# Altium integrated library Lattice CPLD ispLSI.IntLib: 471 symbols (part 15 of 26) (continued)
## ispLSI3256A-70LQI (continued)
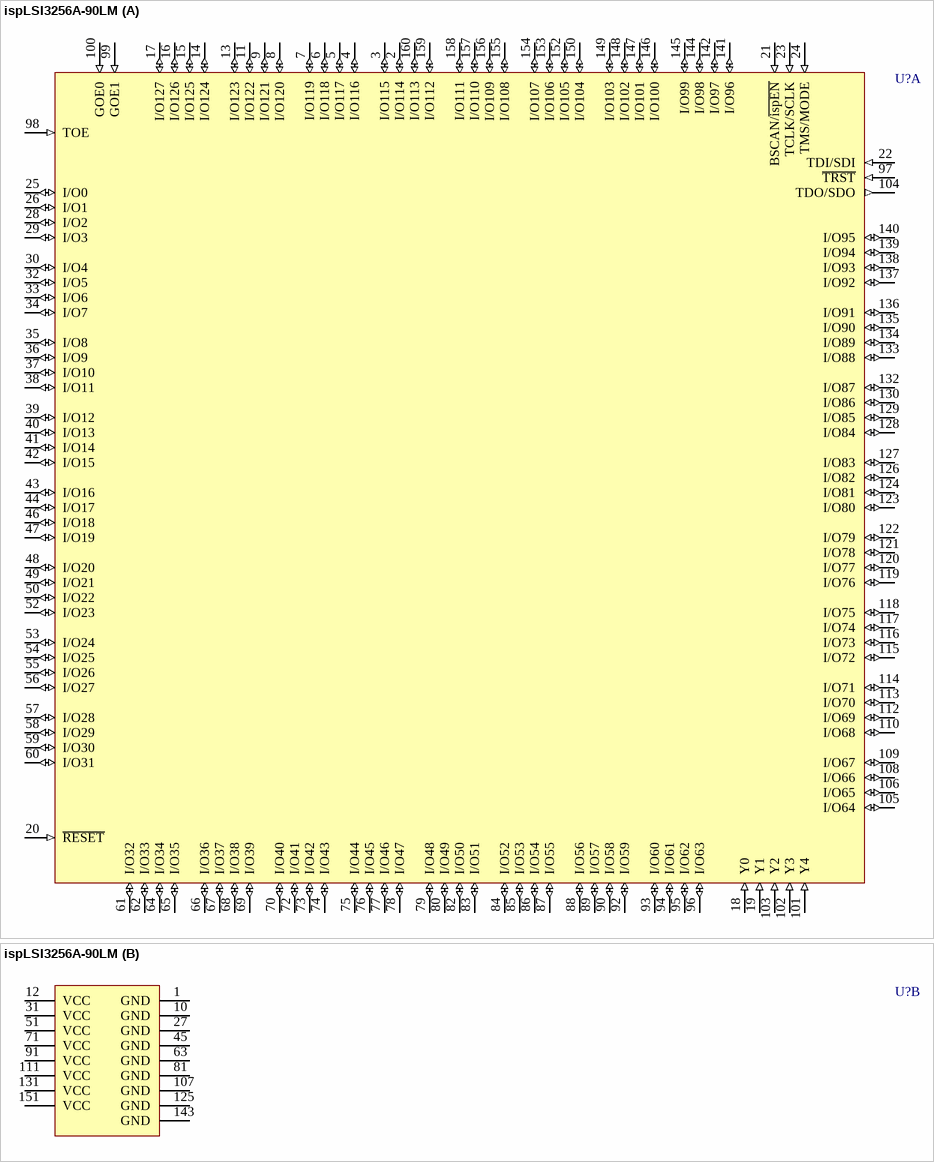
[diagram p137: symbol ispLSI3256A-90LM]

## ispLSI3256A-90LM
designator U?
In-System Programmable High-Density PLD; Note: Pins 21, 22, 23, 24 and 104 have dual function capability.; Published: 23-Sep-2002; LatestRevisionDate: 13-Apr-2006; LatestRevisionNote: IPC-7351 Footprint Added.; DatasheetVersion: May-1999; PackageVersion: May-1999; PackageReference: MQFP160; Publisher: Altium Limited; PackageDescription: 160-Pin Quad Flat Pack 0.65 mm Pitch; Code_IPC: QFP65P3120X3120-160; ComponentLink1Description: Manufacturer Link; ComponentLink1URL: http://www.latticesemi.com/products/mature/index.cfm; ComponentLink2Description: Datasheet; ComponentLink2URL: http://www.latticesemi.com/lit/docs/datasheets/cpld/3256a.pdf
footprint MQFP160_N (QFP, 160-Leads, Body 27.7 x 27.7mm, Pitch 0.65mm, IPC Medium Density)
footprint MQFP160_L (QFP, 160-Leads, Body 27.7 x 27.7mm, Pitch 0.65mm, IPC High Density)
footprint MQFP160_M (QFP, 160-Leads, Body 27.7 x 27.7mm, Pitch 0.65mm, IPC Low Density)
3D model 3256A-MQFP160 (160-Pin Quad Flat Pack 0.65 mm Pitch)
part A pins: 2 I/O114 (io), 3 I/O115 (io), 4 I/O116 (io), 5 I/O117 (io), 6 I/O118 (io), 7 I/O119 (io), 8 I/O120 (io), 9 I/O121 (io), 11 I/O122 (io), 13 I/O123 (io), 14 I/O124 (io), 15 I/O125 (io), 16 I/O126 (io), 17 I/O127 (io), 18 Y0 (in), 19 Y1 (in), 20 ~{RESET} (in), 21 BSCAN/~{ispEN} (in), 22 TDI/SDI (in), 23 TCLK/SCLK (in), 24 TMS/MODE (in), 25 I/O0 (io), 26 I/O1 (io), 28 I/O2 (io), 29 I/O3 (io), 30 I/O4 (io), 32 I/O5 (io), 33 I/O6 (io), 34 I/O7 (io), 35 I/O8 (io), 36 I/O9 (io), 37 I/O10 (io), 38 I/O11 (io), 39 I/O12 (io), 40 I/O13 (io), 41 I/O14 (io), 42 I/O15 (io), 43 I/O16 (io), 44 I/O17 (io), 46 I/O18 (io), 47 I/O19 (io), 48 I/O20 (io), 49 I/O21 (io), 50 I/O22 (io), 52 I/O23 (io), 53 I/O24 (io), 54 I/O25 (io), 55 I/O26 (io), 56 I/O27 (io), 57 I/O28 (io), 58 I/O29 (io), 59 I/O30 (io), 60 I/O31 (io), 61 I/O32 (io), 62 I/O33 (io), 64 I/O34 (io), 65 I/O35 (io), 66 I/O36 (io), 67 I/O37 (io), 68 I/O38 (io), 69 I/O39 (io), 70 I/O40 (io), 72 I/O41 (io), 73 I/O42 (io), 74 I/O43 (io), 75 I/O44 (io), 76 I/O45 (io), 77 I/O46 (io), 78 I/O47 (io), 79 I/O48 (io), 80 I/O49 (io), 82 I/O50 (io), 83 I/O51 (io), 84 I/O52 (io), 85 I/O53 (io), 86 I/O54 (io), 87 I/O55 (io), 88 I/O56 (io), 89 I/O57 (io), 90 I/O58 (io), 92 I/O59 (io), 93 I/O60 (io), 94 I/O61 (io), 95 I/O62 (io), 96 I/O63 (io), 97 ~{TRST} (in), 98 TOE (in), 99 GOE1 (in), 100 GOE0 (in), 101 Y4 (in), 102 Y3 (in), 103 Y2 (in), 104 TDO/SDO (out), 105 I/O64 (io), 106 I/O65 (io), 108 I/O66 (io), 109 I/O67 (io), 110 I/O68 (io), 112 I/O69 (io), 113 I/O70 (io), 114 I/O71 (io), 115 I/O72 (io), 116 I/O73 (io), 117 I/O74 (io), 118 I/O75 (io), 119 I/O76 (io), 120 I/O77 (io), 121 I/O78 (io), 122 I/O79 (io), 123 I/O80 (io), 124 I/O81 (io), 126 I/O82 (io), 127 I/O83 (io), 128 I/O84 (io), 129 I/O85 (io), 130 I/O86 (io), 132 I/O87 (io), 133 I/O88 (io), 134 I/O89 (io), 135 I/O90 (io), 136 I/O91 (io), 137 I/O92 (io), 138 I/O93 (io), 139 I/O94 (io), 140 I/O95 (io), 141 I/O96 (io), 142 I/O97 (io), 144 I/O98 (io), 145 I/O99 (io), 146 I/O100 (io), 147 I/O101 (io), 148 I/O102 (io), 149 I/O103 (io), 150 I/O104 (io), 152 I/O105 (io), 153 I/O106 (io), 154 I/O107 (io), 155 I/O108 (io), 156 I/O109 (io), 157 I/O110 (io), 158 I/O111 (io), 159 I/O112 (io), 160 I/O113 (io)
part B pins: 1 GND (power), 10 GND (power), 12 VCC (power), 27 GND (power), 31 VCC (power), 45 GND (power), 51 VCC (power), 63 GND (power), 71 VCC (power), 81 GND (power), 91 VCC (power), 107 GND (power), 111 VCC (power), 125 GND (power), 131 VCC (power), 143 GND (power), 151 VCC (power)

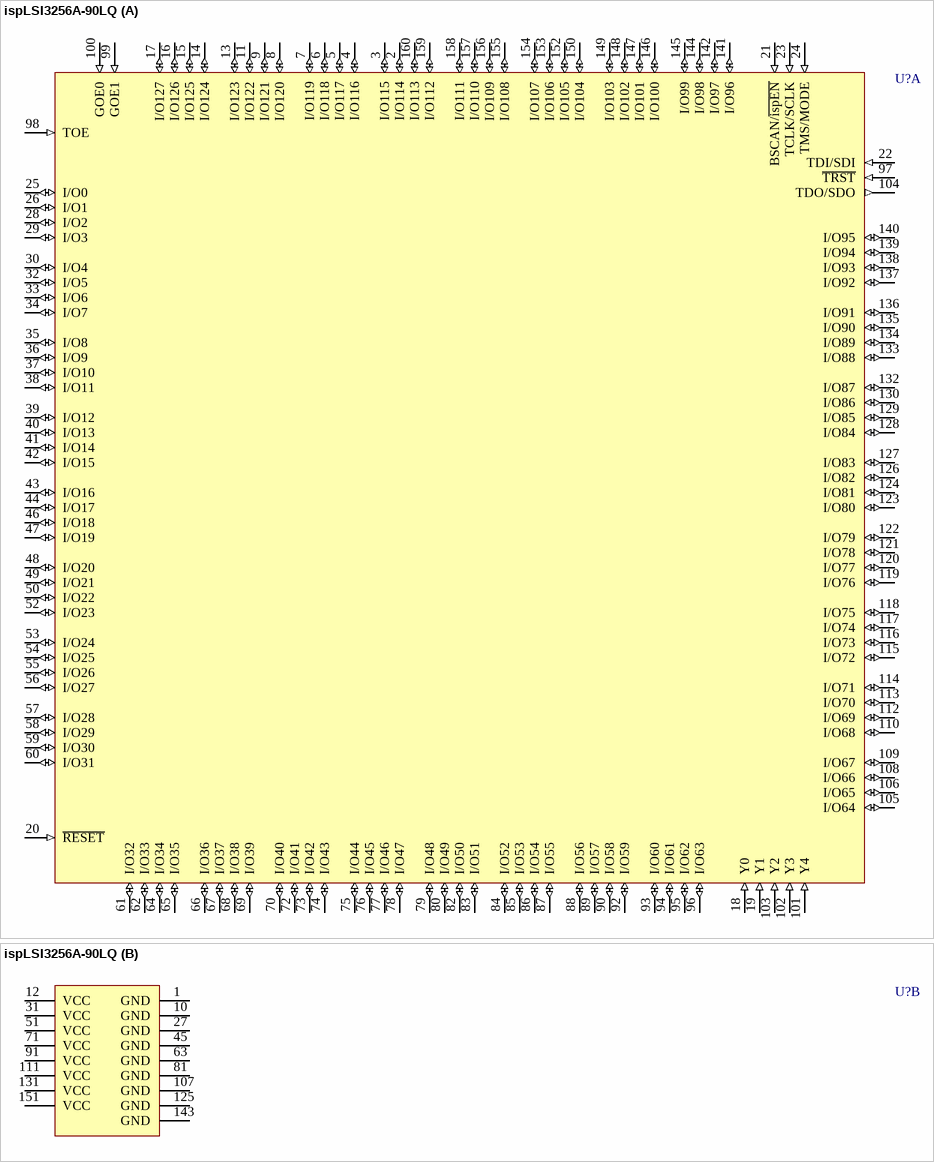
[diagram p138: symbol ispLSI3256A-90LQ]

## ispLSI3256A-90LQ
designator U?
In-System Programmable High-Density PLD; Note: Pins 21, 22, 23, 24 and 104 have dual function capability.; Published: 23-Sep-2002; LatestRevisionDate: 13-Apr-2006; LatestRevisionNote: IPC-7351 Footprint Added.; DatasheetVersion: May-1999; PackageVersion: pkg_32, Aug-2005; PackageReference: PQFP160; Publisher: Altium Limited; PackageDescription: 160-Pin Quad Flat Pack 0.65 mm Pitch; Code_IPC: QFP65P3120X3120-160; ComponentLink1Description: Manufacturer Link; ComponentLink1URL: http://www.latticesemi.com/products/mature/index.cfm; ComponentLink2Description: Datasheet; ComponentLink2URL: http://www.latticesemi.com/lit/docs/datasheets/cpld/3256a.pdf
footprint PQFP160_N (QFP, 160-Leads, Body 28 x 28mm, Pitch 0.65mm, IPC Medium Density)
footprint PQFP160_L (QFP, 160-Leads, Body 28 x 28mm, Pitch 0.65mm, IPC High Density)
footprint PQFP160_M (QFP, 160-Leads, Body 28 x 28mm, Pitch 0.65mm, IPC Low Density)
3D model 3256A-PQFP160 (160-Pin Quad Flat Pack 0.65 mm Pitch)
part A pins: 2 I/O114 (io), 3 I/O115 (io), 4 I/O116 (io), 5 I/O117 (io), 6 I/O118 (io), 7 I/O119 (io), 8 I/O120 (io), 9 I/O121 (io), 11 I/O122 (io), 13 I/O123 (io), 14 I/O124 (io), 15 I/O125 (io), 16 I/O126 (io), 17 I/O127 (io), 18 Y0 (in), 19 Y1 (in), 20 ~{RESET} (in), 21 BSCAN/~{ispEN} (in), 22 TDI/SDI (in), 23 TCLK/SCLK (in), 24 TMS/MODE (in), 25 I/O0 (io), 26 I/O1 (io), 28 I/O2 (io), 29 I/O3 (io), 30 I/O4 (io), 32 I/O5 (io), 33 I/O6 (io), 34 I/O7 (io), 35 I/O8 (io), 36 I/O9 (io), 37 I/O10 (io), 38 I/O11 (io), 39 I/O12 (io), 40 I/O13 (io), 41 I/O14 (io), 42 I/O15 (io), 43 I/O16 (io), 44 I/O17 (io), 46 I/O18 (io), 47 I/O19 (io), 48 I/O20 (io), 49 I/O21 (io), 50 I/O22 (io), 52 I/O23 (io), 53 I/O24 (io), 54 I/O25 (io), 55 I/O26 (io), 56 I/O27 (io), 57 I/O28 (io), 58 I/O29 (io), 59 I/O30 (io), 60 I/O31 (io), 61 I/O32 (io), 62 I/O33 (io), 64 I/O34 (io), 65 I/O35 (io), 66 I/O36 (io), 67 I/O37 (io), 68 I/O38 (io), 69 I/O39 (io), 70 I/O40 (io), 72 I/O41 (io), 73 I/O42 (io), 74 I/O43 (io), 75 I/O44 (io), 76 I/O45 (io), 77 I/O46 (io), 78 I/O47 (io), 79 I/O48 (io), 80 I/O49 (io), 82 I/O50 (io), 83 I/O51 (io), 84 I/O52 (io), 85 I/O53 (io), 86 I/O54 (io), 87 I/O55 (io), 88 I/O56 (io), 89 I/O57 (io), 90 I/O58 (io), 92 I/O59 (io), 93 I/O60 (io), 94 I/O61 (io), 95 I/O62 (io), 96 I/O63 (io), 97 ~{TRST} (in), 98 TOE (in), 99 GOE1 (in), 100 GOE0 (in), 101 Y4 (in), 102 Y3 (in), 103 Y2 (in), 104 TDO/SDO (out), 105 I/O64 (io), 106 I/O65 (io), 108 I/O66 (io), 109 I/O67 (io), 110 I/O68 (io), 112 I/O69 (io), 113 I/O70 (io), 114 I/O71 (io), 115 I/O72 (io), 116 I/O73 (io), 117 I/O74 (io), 118 I/O75 (io), 119 I/O76 (io), 120 I/O77 (io), 121 I/O78 (io), 122 I/O79 (io), 123 I/O80 (io), 124 I/O81 (io), 126 I/O82 (io), 127 I/O83 (io), 128 I/O84 (io), 129 I/O85 (io), 130 I/O86 (io), 132 I/O87 (io), 133 I/O88 (io), 134 I/O89 (io), 135 I/O90 (io), 136 I/O91 (io), 137 I/O92 (io), 138 I/O93 (io), 139 I/O94 (io), 140 I/O95 (io), 141 I/O96 (io), 142 I/O97 (io), 144 I/O98 (io), 145 I/O99 (io), 146 I/O100 (io), 147 I/O101 (io), 148 I/O102 (io), 149 I/O103 (io), 150 I/O104 (io), 152 I/O105 (io), 153 I/O106 (io), 154 I/O107 (io), 155 I/O108 (io), 156 I/O109 (io), 157 I/O110 (io), 158 I/O111 (io), 159 I/O112 (io), 160 I/O113 (io)
part B pins: 1 GND (power), 10 GND (power), 12 VCC (power), 27 GND (power), 31 VCC (power), 45 GND (power), 51 VCC (power), 63 GND (power), 71 VCC (power), 81 GND (power), 91 VCC (power), 107 GND (power), 111 VCC (power), 125 GND (power), 131 VCC (power), 143 GND (power), 151 VCC (power)

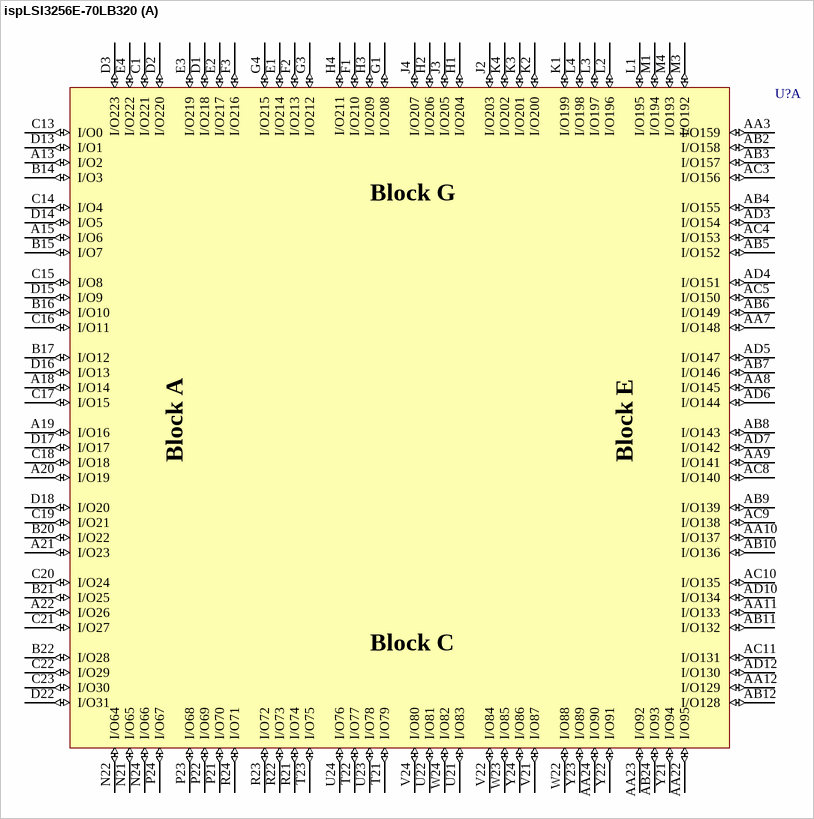
[diagram p139: symbol ispLSI3256E-70LB320]

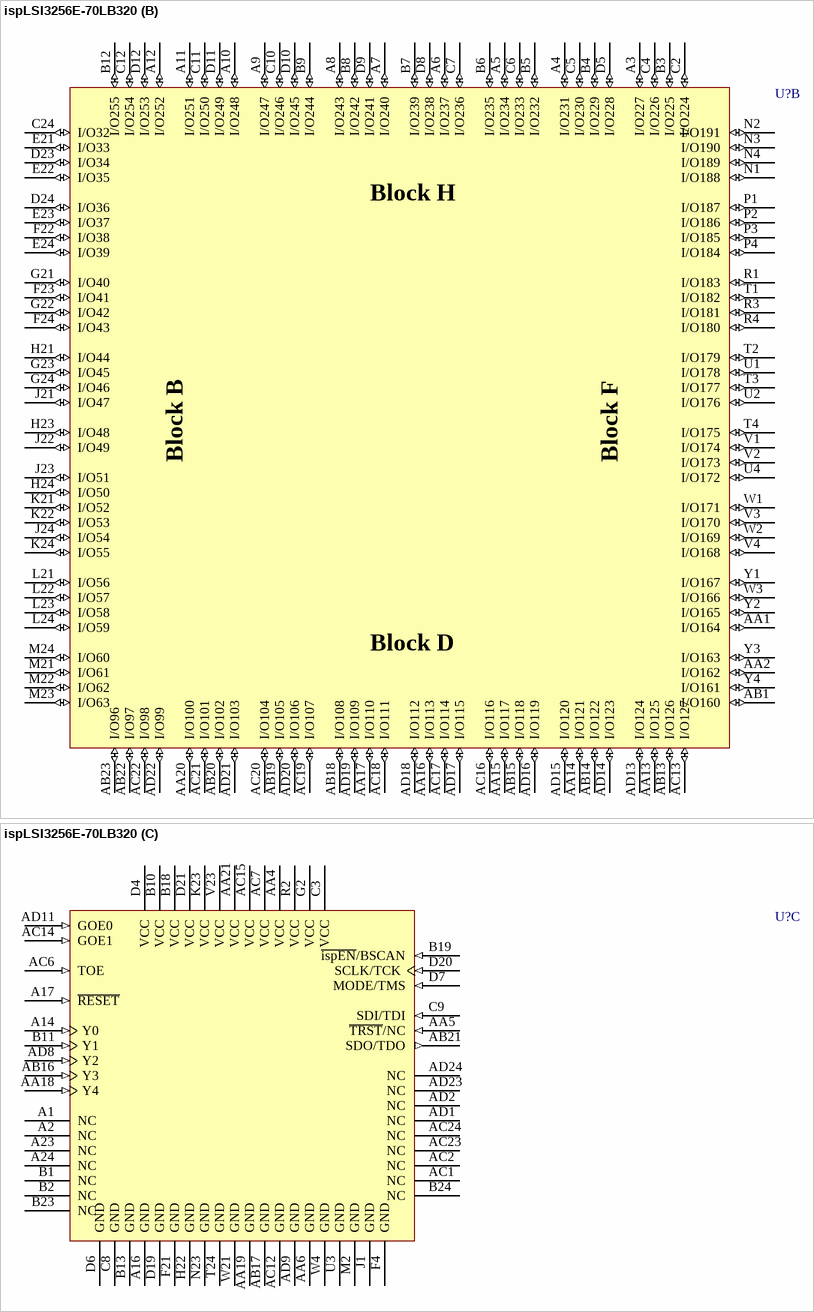
[diagram p140: symbol ispLSI3256E-70LB320]

## ispLSI3256E-70LB320
designator U?
In-System Programmable High-Density PLD; Published: 23-Sep-2002; LatestRevisionDate: 13-Apr-2006; LatestRevisionNote: IPC-7351 Footprint Added.; DatasheetVersion: May-1999; PackageVersion: pkg_32, Aug-2005; PackageReference: SBGA320; Publisher: Altium Limited; PackageDescription: 320-Ball Super Ball Grid Array (SBGA320); ComponentLink1Description: Manufacturer Link; ComponentLink1URL: http://www.latticesemi.com/products/mature/index.cfm; ComponentLink2Description: Datasheet; ComponentLink2URL: http://www.latticesemi.com/lit/docs/datasheets/cpld/3256e.pdf
footprint SBGA320 (BGA, 320-Leads, Body 31x31mm, Pitch 1.27mm)
3D model 3256E-SBGA320 (320-Ball Super Ball Grid Array (SBGA320))
part A pins: A13 I/O2 (io), A15 I/O6 (io), A18 I/O14 (io), A19 I/O16 (io), A20 I/O19 (io), A21 I/O23 (io), A22 I/O26 (io), AA3 I/O159 (io), AA7 I/O148 (io), AA8 I/O145 (io), AA9 I/O141 (io), AA10 I/O137 (io), AA11 I/O133 (io), AA12 I/O129 (io), AA22 I/O95 (io), AA23 I/O92 (io), AA24 I/O90 (io), AB2 I/O158 (io), AB3 I/O157 (io), AB4 I/O155 (io), AB5 I/O152 (io), AB6 I/O149 (io), AB7 I/O146 (io), AB8 I/O143 (io), AB9 I/O139 (io), AB10 I/O136 (io), AB11 I/O132 (io), AB12 I/O128 (io), AB24 I/O93 (io), AC3 I/O156 (io), AC4 I/O153 (io), AC5 I/O150 (io), AC8 I/O140 (io), AC9 I/O138 (io), AC10 I/O135 (io), AC11 I/O131 (io), AD3 I/O154 (io), AD4 I/O151 (io), AD5 I/O147 (io), AD6 I/O144 (io), AD7 I/O142 (io), AD10 I/O134 (io), AD12 I/O130 (io), B14 I/O3 (io), B15 I/O7 (io), B16 I/O10 (io), B17 I/O12 (io), B20 I/O22 (io), B21 I/O25 (io), B22 I/O28 (io), C1 I/O221 (io), C13 I/O0 (io), C14 I/O4 (io), C15 I/O8 (io), C16 I/O11 (io), C17 I/O15 (io), C18 I/O18 (io), C19 I/O21 (io), C20 I/O24 (io), C21 I/O27 (io), C22 I/O29 (io), C23 I/O30 (io), D1 I/O218 (io), D2 I/O220 (io), D3 I/O223 (io), D13 I/O1 (io), D14 I/O5 (io), D15 I/O9 (io), D16 I/O13 (io), D17 I/O17 (io), D18 I/O20 (io), D22 I/O31 (io), E1 I/O214 (io), E2 I/O217 (io), E3 I/O219 (io), E4 I/O222 (io), F1 I/O210 (io), F2 I/O213 (io), F3 I/O216 (io), G1 I/O208 (io), G3 I/O212 (io), G4 I/O215 (io), H1 I/O204 (io), H2 I/O206 (io), H3 I/O209 (io), H4 I/O211 (io), J2 I/O203 (io), J3 I/O205 (io), J4 I/O207 (io), K1 I/O199 (io), K2 I/O200 (io), K3 I/O201 (io), K4 I/O202 (io), L1 I/O195 (io), L2 I/O196 (io), L3 I/O197 (io), L4 I/O198 (io), M1 I/O194 (io), M3 I/O192 (io), M4 I/O193 (io), N21 I/O65 (io), N22 I/O64 (io), N24 I/O66 (io), P21 I/O70 (io), P22 I/O69 (io), P23 I/O68 (io), P24 I/O67 (io), R21 I/O74 (io), R22 I/O73 (io), R23 I/O72 (io), R24 I/O71 (io), T21 I/O79 (io), T22 I/O77 (io), T23 I/O75 (io), U21 I/O83 (io), U22 I/O81 (io), U23 I/O78 (io), U24 I/O76 (io), V21 I/O87 (io), V22 I/O84 (io), V24 I/O80 (io), W22 I/O88 (io), W23 I/O85 (io), W24 I/O82 (io), Y21 I/O94 (io), Y22 I/O91 (io), Y23 I/O89 (io), Y24 I/O86 (io)
part B pins: A3 I/O227 (io), A4 I/O231 (io), A5 I/O234 (io), A6 I/O237 (io), A7 I/O240 (io), A8 I/O243 (io), A9 I/O247 (io), A10 I/O248 (io), A11 I/O251 (io), A12 I/O252 (io), AA1 I/O164 (io), AA2 I/O162 (io), AA13 I/O125 (io), AA14 I/O121 (io), AA15 I/O117 (io), AA16 I/O113 (io), AA17 I/O110 (io), AA20 I/O100 (io), AB1 I/O160 (io), AB13 I/O126 (io), AB14 I/O122 (io), AB15 I/O118 (io), AB18 I/O108 (io), AB19 I/O105 (io), AB20 I/O102 (io), AB22 I/O97 (io), AB23 I/O96 (io), AC13 I/O127 (io), AC16 I/O116 (io), AC17 I/O114 (io), AC18 I/O111 (io), AC19 I/O107 (io), AC20 I/O104 (io), AC21 I/O101 (io), AC22 I/O98 (io), AD13 I/O124 (io), AD14 I/O123 (io), AD15 I/O120 (io), AD16 I/O119 (io), AD17 I/O115 (io), AD18 I/O112 (io), AD19 I/O109 (io), AD20 I/O106 (io), AD21 I/O103 (io), AD22 I/O99 (io), B3 I/O225 (io), B4 I/O229 (io), B5 I/O232 (io), B6 I/O235 (io), B7 I/O239 (io), B8 I/O242 (io), B9 I/O244 (io), B12 I/O255 (io), C2 I/O224 (io), C4 I/O226 (io), C5 I/O230 (io), C6 I/O233 (io), C7 I/O236 (io), C10 I/O246 (io), C11 I/O250 (io), C12 I/O254 (io), C24 I/O32 (io), D5 I/O228 (io), D8 I/O238 (io), D9 I/O241 (io), D10 I/O245 (io), D11 I/O249 (io), D12 I/O253 (io), D23 I/O34 (io), D24 I/O36 (io), E21 I/O33 (io), E22 I/O35 (io), E23 I/O37 (io), E24 I/O39 (io), F22 I/O38 (io), F23 I/O41 (io), F24 I/O43 (io), G21 I/O40 (io), G22 I/O42 (io), G23 I/O45 (io), G24 I/O46 (io), H21 I/O44 (io), H23 I/O48 (io), H24 I/O50 (io), J21 I/O47 (io), J22 I/O49 (io), J23 I/O51 (io), J24 I/O54 (io), K21 I/O52 (io), K22 I/O53 (io), K24 I/O55 (io), L21 I/O56 (io), L22 I/O57 (io), L23 I/O58 (io), L24 I/O59 (io), M21 I/O61 (io), M22 I/O62 (io), M23 I/O63 (io), M24 I/O60 (io), N1 I/O188 (io), N2 I/O191 (io), N3 I/O190 (io), N4 I/O189 (io), P1 I/O187 (io), P2 I/O186 (io), P3 I/O185 (io), P4 I/O184 (io), R1 I/O183 (io), R3 I/O181 (io), R4 I/O180 (io), T1 I/O182 (io), T2 I/O179 (io), T3 I/O177 (io), T4 I/O175 (io), U1 I/O178 (io), U2 I/O176 (io), U4 I/O172 (io), V1 I/O174 (io), V2 I/O173 (io), V3 I/O170 (io), V4 I/O168 (io), W1 I/O171 (io), W2 I/O169 (io), W3 I/O166 (io), Y1 I/O167 (io), Y2 I/O165 (io), Y3 I/O163 (io), Y4 I/O161 (io)
part C pins: A1 NC, A2 NC, A14 Y0 (in), A16 GND (power), A17 ~{RESET} (in), A23 NC, A24 NC, AA4 VCC (power), AA5 ~{TRST}/NC (in), AA6 GND (power), AA18 Y4 (in), AA19 GND (power), AA21 VCC (power), AB16 Y3 (in), AB17 GND (power), AB21 SDO/TDO (out), AC1 NC, AC2 NC, AC6 TOE (in), AC7 VCC (power), AC12 GND (power), AC14 GOE1 (in), AC15 VCC (power), AC23 NC, AC24 NC, AD1 NC, AD2 NC, AD8 Y2 (in), AD9 GND (power), AD11 GOE0 (in), AD23 NC, AD24 NC, B1 NC, B2 NC, B10 VCC (power), B11 Y1 (in), B13 GND (power), B18 VCC (power), B19 ~{ispEN}/BSCAN (in), B23 NC, B24 NC, C3 VCC (power), C8 GND (power), C9 SDI/TDI (in), D4 VCC (power), D6 GND (power), D7 MODE/TMS (in), D19 GND (power), D20 SCLK/TCK (in), D21 VCC (power), F4 GND (power), F21 GND (power), G2 VCC (power), H22 GND (power), J1 GND (power), K23 VCC (power), M2 GND (power), N23 GND (power), R2 VCC (power), T24 GND (power), U3 GND (power), V23 VCC (power), W4 GND (power), W21 GND (power)
part A text: Block G; Block A; Block E; Block C
part B text: Block H; Block B; Block F; Block D

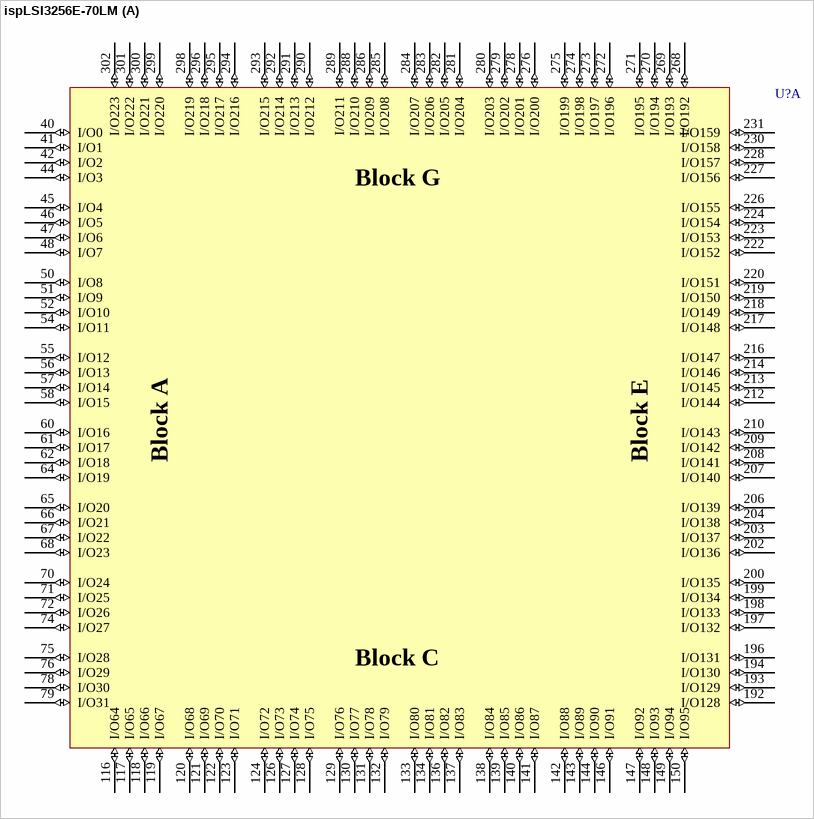
[diagram p141: symbol ispLSI3256E-70LM]

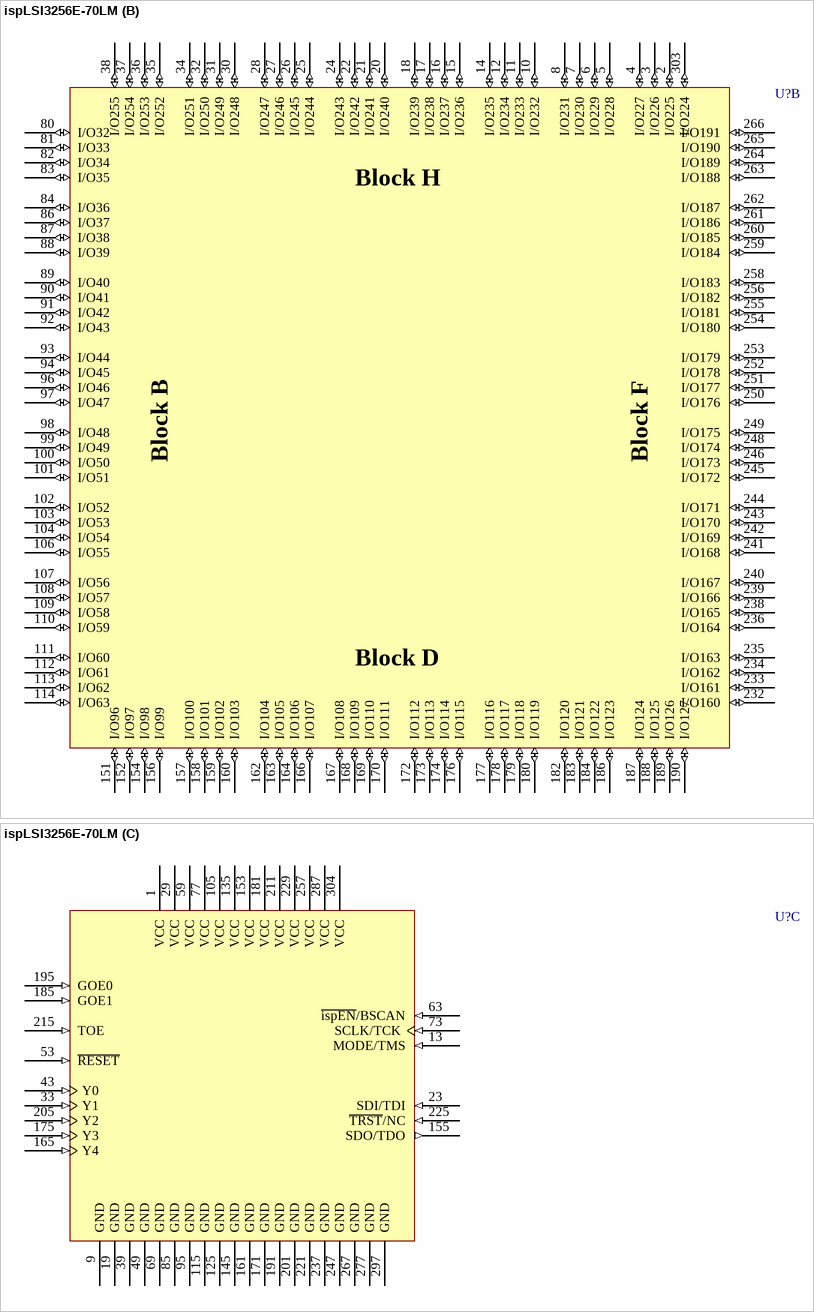
[diagram p142: symbol ispLSI3256E-70LM]